# Altium footprint library En.PcbLib: 240 footprints (part 15 of 15)
Each footprint in its own frame and in the unit in brackets; x right, y up, seen from the top. Pads: shape width x height; smd on the part's side, far side on the other; paste and mask are expansions set on the pad; w line width, h text height; cw(c..) or ccw(c..) is an arc to the next point about the centre after c.
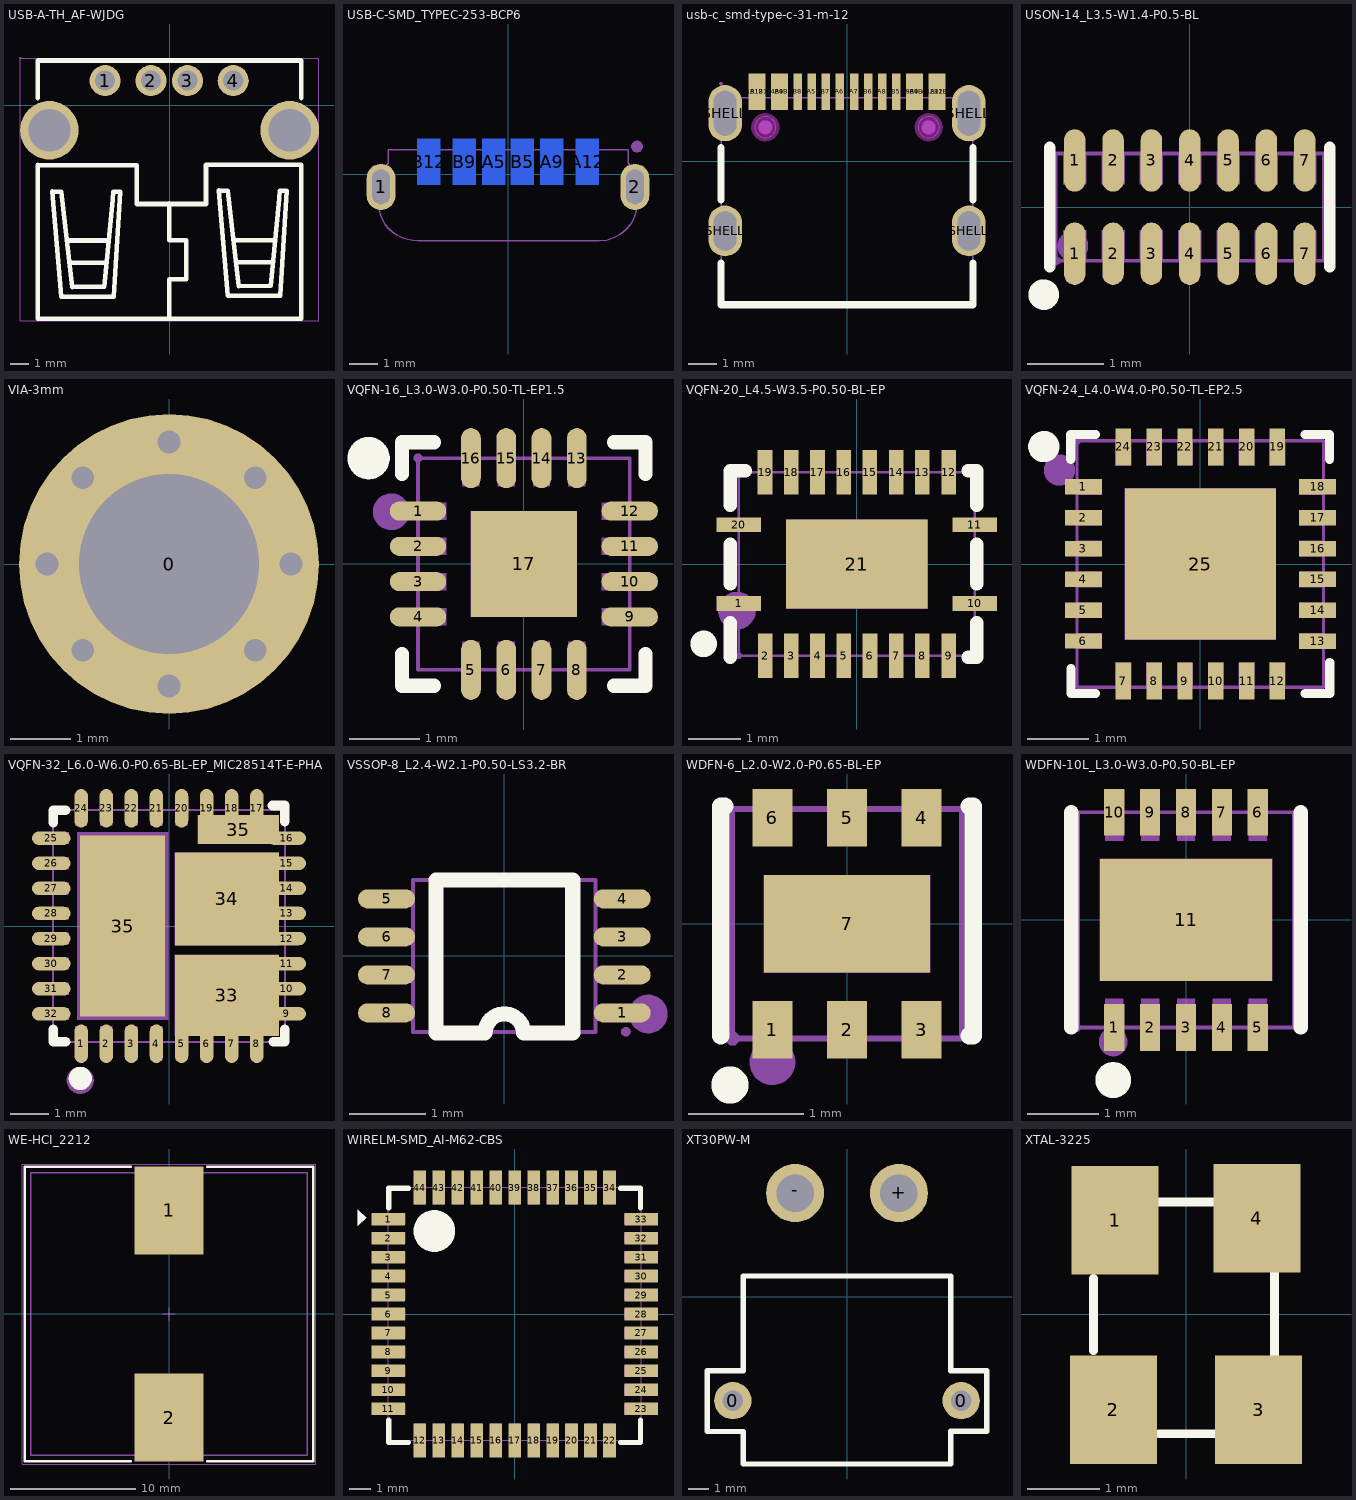
[diagram p14: the footprints below, top view; thin cyan lines are the x and y axes]

## USB-A-TH_AF-WJDG [mm]
pads (6):
  round 1.7 hole 1.1: 1(-3.52,1.355) 2(-1.019,1.355) 3(0.98,1.355) 4(3.48,1.355)
  round 3.2 hole 2.3: ""(-6.57,-1.355) ""(6.57,-1.355)
Top Overlay:
  lines w0.254: -7.199,-3.236 -7.199,-11.655 7.201,-11.655 7.201,-3.236 ; -7.199,0.404 -7.199,2.46 7.201,2.46 7.201,0.404 ; -7.19,-3.266 -1.79,-3.266 -1.79,-5.385 1.99,-5.385 1.99,-3.245 7.19,-3.245 ; -5.609,-7.385 -3.349,-7.385 ; -5.469,-8.595 -3.439,-8.595 ; -0.01,-11.525 -0.01,-9.495 0.91,-9.495 0.91,-7.375 -0.01,-7.375 -0.01,-5.355 ; 3.49,-7.366 5.75,-7.366 ; 3.63,-8.576 5.66,-8.576 ; -6.42,-4.706 -5.911,-4.709 -5.401,-9.25 -5.325,-9.928 -3.576,-9.917 -3.102,-5.139 -3.072,-4.709 -2.691,-4.709 -3.041,-10.452 -5.925,-10.441 -6.42,-4.706 ; 2.682,-4.652 3.19,-4.656 3.701,-9.196 3.776,-9.874 5.526,-9.864 6,-5.085 6.03,-4.655 6.41,-4.655 6.06,-10.398 3.177,-10.387 2.682,-4.652
Mechanical 15:
  region: -8.11,2.587 -8.11,2.612 -8.145,2.647 -8.195,2.648 -8.23,2.612 -8.23,2.588 -8.23,2.563 -8.195,2.528 -8.145,2.527 -8.11,2.563
  region: 7.62,-1.355 7.619,-1.218 7.545,-0.953 7.406,-0.716 7.211,-0.523 6.973,-0.386 6.707,-0.316 6.433,-0.316 6.167,-0.386 5.929,-0.523 5.734,-0.716 5.595,-0.953 5.522,-1.217 5.52,-1.355 5.522,-1.492 5.595,-1.757 5.734,-1.994 5.929,-2.187 6.167,-2.323 6.433,-2.394 6.707,-2.394 6.973,-2.323 7.211,-2.187 7.406,-1.994 7.545,-1.757 7.619,-1.492
  region: -5.52,-1.355 -5.521,-1.218 -5.595,-0.953 -5.734,-0.716 -5.929,-0.523 -6.167,-0.386 -6.433,-0.316 -6.707,-0.316 -6.973,-0.386 -7.211,-0.523 -7.406,-0.716 -7.545,-0.953 -7.618,-1.217 -7.62,-1.355 -7.618,-1.492 -7.545,-1.757 -7.406,-1.994 -7.211,-2.187 -6.973,-2.323 -6.707,-2.394 -6.433,-2.394 -6.167,-2.323 -5.929,-2.187 -5.734,-1.994 -5.595,-1.757 -5.521,-1.492
  region: -3.07,1.355 -3.071,1.444 -3.141,1.607 -3.267,1.732 -3.432,1.8 -3.609,1.8 -3.773,1.732 -3.9,1.607 -3.969,1.444 -3.97,1.355 -3.969,1.266 -3.9,1.103 -3.774,0.978 -3.609,0.91 -3.432,0.91 -3.267,0.978 -3.141,1.103 -3.072,1.266
  region: -0.569,1.355 -0.57,1.444 -0.639,1.607 -0.765,1.732 -0.93,1.8 -1.107,1.8 -1.272,1.732 -1.398,1.607 -1.467,1.444 -1.468,1.355 -1.467,1.266 -1.398,1.103 -1.272,0.978 -1.107,0.91 -0.93,0.91 -0.765,0.978 -0.639,1.103 -0.57,1.266
  region: 1.43,1.355 1.429,1.444 1.36,1.607 1.234,1.732 1.069,1.8 0.892,1.8 0.727,1.732 0.601,1.607 0.532,1.444 0.531,1.355 0.532,1.266 0.601,1.103 0.727,0.978 0.892,0.91 1.069,0.91 1.234,0.978 1.36,1.103 1.429,1.266
  region: 3.93,1.355 3.929,1.444 3.859,1.607 3.733,1.732 3.569,1.8 3.391,1.8 3.227,1.732 3.1,1.607 3.031,1.444 3.03,1.355 3.031,1.266 3.1,1.103 3.227,0.978 3.391,0.91 3.569,0.91 3.733,0.978 3.859,1.103 3.929,1.266
  lines w0.051: -8.17,-11.782 -8.17,2.587 8.17,2.587 8.17,-11.782 -8.17,-11.782
3D body "User Library-USB-A-01.SLDPRT": height 6.95, standoff -4.2, extent -7.9,-11.16 7.9,2.54

## USB-C-SMD_TYPEC-253-BCP6 [mm]
pads (8):
  oval 1x1.6 hole 0.61 slot 1.2 at 90 deg: 1(-4.4,-0.435) 2(4.4,-0.435)
  rect 0.8x1.6 smd far side: A5(-0.5,0.435) A9(1.52,0.435) A12(2.75,0.435) B5(0.5,0.435) B9(-1.52,0.435) B12(-2.75,0.435)
Bottom Overlay:
  lines w0.254: -4.445,-2.27 4.445,-2.27 4.445,-1.395 ; -4.445,-2.143 -4.445,-1.395 ; -4.445,0.665 -4.445,1.286 -3.254,1.286 ; 3.508,1.286 4.445,1.286 4.445,0.665
Mechanical 15:
  region: 4.25,-0.935 4.55,-0.935 4.55,0.065 4.25,0.065
  region: -4.55,-0.935 -4.25,-0.935 -4.25,0.065 -4.55,0.065
  region: 0.24,-0.343 0.76,-0.343 0.76,0.957 0.24,0.957
  region: -0.76,-0.343 -0.24,-0.343 -0.24,0.957 -0.76,0.957
  region: 1.24,-0.343 1.8,-0.343 1.8,0.957 1.24,0.957
  region: -1.8,-0.343 -1.24,-0.343 -1.24,0.957 -1.8,0.957
  region: 2.45,-0.343 3.05,-0.343 3.05,0.957 2.45,0.957
  region: -3.05,-0.343 -2.45,-0.343 -2.45,0.957 -3.05,0.957
  region: 4.672,0.957 4.672,0.917 4.642,0.844 4.585,0.787 4.512,0.757 4.432,0.757 4.359,0.787 4.302,0.844 4.272,0.917 4.272,0.957 4.272,0.997 4.302,1.07 4.359,1.127 4.432,1.157 4.512,1.157 4.585,1.127 4.642,1.07 4.672,0.997
  lines w0.051: -4.47,-1.067 ccw(c-3.314,-1.067) -4.131,-1.885 ccw(c-3.117,-0.871) -3.117,-2.304 -3.105,-2.304 -3.057,-2.305 3.172,-2.305 3.426,-2.282 3.672,-2.205 3.892,-2.084 4.085,-1.929 4.249,-1.727 4.369,-1.508 4.448,-1.259 4.472,-1.006 4.471,0.073 4.36,0.073 4.25,0.273 4.161,0.385 4.16,0.857 -4.16,0.857 -4.16,0.385 -4.252,0.275 -4.356,0.076 -4.469,0.076 -4.47,-0.869 -4.47,-1.067
3D body "typec-253-bcp6.step": height 6.49, standoff -1.01, extent -4.495,-1.971 4.445,1.21

## usb-c_smd-type-c-31-m-12 [mm]
pads (20):
  rect 0.3x1.3 smd paste-100 mask+0.051: A1B12(-3.35,2.474) A1B12(-3.05,2.474) A4B9(-2.55,2.474) A4B9(-2.25,2.474) A5(-1.25,2.474) A6(-0.25,2.474) A7(0.25,2.474) A8(1.25,2.474) A9B4(2.25,2.474) A9B4(2.55,2.474) A12B1(3.05,2.474) A12B1(3.35,2.474) B5(1.75,2.474) B6(0.75,2.474) B7(-0.75,2.474) B8(-1.75,2.474)
  oval 1.2x1.8 hole 0.8 slot 1.4 at 90 deg: SHELL(-4.325,-2.474) SHELL(4.325,-2.474)
  oval 1.2x2 hole 0.8 slot 1.6 at 90 deg: SHELL(-4.325,1.706) SHELL(4.325,1.706)
Top Overlay:
  lines w0.254: -4.469,-3.613 -4.469,-5.094 4.471,-5.094 4.471,-3.612 ; -4.469,-1.376 -4.469,0.487 ; 4.471,-1.376 4.471,0.488
Top Paste:
  drawing of 16 lines, arcs and shapes, not listed
Keep-Out Layer:
  board cut-out: -2.525,1.206 -2.525,1.28 -2.582,1.418 -2.688,1.524 -2.825,1.581 -2.975,1.581 -3.112,1.524 -3.218,1.418 -3.275,1.28 -3.275,1.206 -3.275,1.131 -3.218,0.993 -3.112,0.888 -2.975,0.831 -2.825,0.831 -2.688,0.888 -2.582,0.993 -2.525,1.131
  board cut-out: 3.275,1.206 3.275,1.28 3.218,1.418 3.112,1.524 2.974,1.581 2.825,1.581 2.687,1.524 2.582,1.418 2.525,1.28 2.525,1.206 2.525,1.131 2.582,0.993 2.687,0.888 2.825,0.831 2.974,0.831 3.112,0.888 3.218,0.993 3.275,1.131
Mechanical 1:
  circle w0.025: c-2.9,1.206 r0.375
  circle w0.025: c2.9,1.206 r0.375
Mechanical 6:
  circle w0.25: c2.9,1.206 r0.125
  circle w0.25: c-2.9,1.206 r0.125
Mechanical 15:
  region: -4.415,2.756 -4.416,2.78 -4.451,2.813 -4.499,2.813 -4.534,2.78 -4.535,2.756 -4.534,2.732 -4.499,2.699 -4.451,2.699 -4.416,2.732
  region: -4.475,-2.074 -4.175,-2.074 -4.175,-2.874 -4.475,-2.874
  region: 4.175,-2.074 4.475,-2.074 4.475,-2.874 4.175,-2.874
  region: 4.175,2.256 4.475,2.256 4.475,1.156 4.175,1.156
  region: -4.475,2.256 -4.175,2.256 -4.175,1.156 -4.475,1.156
  region: 3.21,2.756 3.41,2.756 3.41,2.056 3.21,2.056
  region: 3.01,2.756 3.21,2.756 3.21,2.056 3.01,2.056
  region: 1.65,2.756 1.85,2.756 1.85,2.056 1.65,2.056
  region: 1.15,2.756 1.35,2.756 1.35,2.056 1.15,2.056
  region: 0.65,2.756 0.85,2.756 0.85,2.056 0.65,2.056
  region: 0.15,2.756 0.35,2.756 0.35,2.056 0.15,2.056
  region: -0.35,2.756 -0.15,2.756 -0.15,2.056 -0.35,2.056
  region: -0.85,2.756 -0.65,2.756 -0.65,2.056 -0.85,2.056
  region: -1.35,2.756 -1.15,2.756 -1.15,2.056 -1.35,2.056
  region: -1.85,2.756 -1.65,2.756 -1.65,2.056 -1.85,2.056
  region: 2.41,2.756 2.61,2.756 2.61,2.056 2.41,2.056
  region: 2.21,2.756 2.41,2.756 2.41,2.056 2.21,2.056
  region: -2.41,2.756 -2.21,2.756 -2.21,2.056 -2.41,2.056
  region: -2.61,2.756 -2.41,2.756 -2.41,2.056 -2.61,2.056
  region: -3.21,2.756 -3.01,2.756 -3.01,2.056 -3.21,2.056
  region: -3.41,2.756 -3.21,2.756 -3.21,2.056 -3.41,2.056
  lines w0.051: -4.47,-5.094 -4.47,2.256 4.47,2.256 4.47,-5.094 -4.47,-5.094
Multi-Layer keep-out:
  circle w0.254: c-2.9,1.206 r0.375
  circle w0.254: c2.9,1.206 r0.375
3D body "type-c 16pin 2md(073).step": height 3.26, standoff -0.9, extent -4.445,-4.971 4.495,2.609

## USON-14_L3.5-W1.4-P0.5-BL [mm]
pads (14):
  oval 0.28x0.815 smd: 1(-1.5,-0.607) 1(-1.5,0.608) 2(-1,-0.607) 2(-1,0.608) 3(-0.5,-0.607) 3(-0.5,0.608) 4(0,-0.607) 4(0,0.608) 5(0.5,-0.607) 5(0.5,0.608) 6(1,-0.607) 6(1,0.608) 7(1.5,-0.607) 7(1.5,0.608)
Top Overlay:
  circle w0.2: c-1.905,-1.143 r0.1
  lines w0.152: -1.826,-0.776 -1.826,0.776 ; 1.826,-0.776 1.826,0.776
Mechanical 6:
  circle w0.2: c-1.524,-0.508 r0.1
Mechanical 15:
  region: -1.35,0.7 -1.35,0.3 -1.65,0.3 -1.65,0.7
  region: -0.85,0.7 -0.85,0.3 -1.15,0.3 -1.15,0.7
  region: -0.35,0.7 -0.35,0.3 -0.65,0.3 -0.65,0.7
  region: 0.15,0.7 0.15,0.3 -0.15,0.3 -0.15,0.7
  region: 0.65,0.7 0.65,0.3 0.35,0.3 0.35,0.7
  region: 1.15,0.7 1.15,0.3 0.85,0.3 0.85,0.7
  region: 1.65,0.7 1.65,0.3 1.35,0.3 1.35,0.7
  region: 1.65,-0.7 1.65,-0.3 1.35,-0.3 1.35,-0.7
  region: 1.15,-0.7 1.15,-0.3 0.85,-0.3 0.85,-0.7
  region: 0.65,-0.7 0.65,-0.3 0.35,-0.3 0.35,-0.7
  region: 0.15,-0.7 0.15,-0.3 -0.15,-0.3 -0.15,-0.7
  region: -0.35,-0.7 -0.35,-0.3 -0.65,-0.3 -0.65,-0.7
  region: -0.85,-0.7 -0.85,-0.3 -1.15,-0.3 -1.15,-0.7
  region: -1.35,-0.7 -1.35,-0.3 -1.65,-0.3 -1.65,-0.7
  region: -1.69,-0.7 -1.691,-0.675 -1.726,-0.641 -1.775,-0.641 -1.81,-0.675 -1.81,-0.7 -1.81,-0.724 -1.775,-0.759 -1.726,-0.759 -1.691,-0.724
  lines w0.051: -1.75,-0.7 1.75,-0.7 1.75,0.7 -1.75,0.7 -1.75,-0.7
3D body "tpd6e05u06rvzr.step": height 0.48, standoff -0.02, extent -1.75,-0.687 1.75,0.686

## VIA-3mm [mm]
height 1.75
pads (1):
  round 5 hole 3: 0(0,0)
via 2.032,0 diameter 0.508 hole 0.381
via 1.437,1.437 diameter 0.508 hole 0.381
via 0,2.032 diameter 0.508 hole 0.381
via -1.437,1.437 diameter 0.508 hole 0.381
via -2.032,0 diameter 0.508 hole 0.381
via -1.437,-1.437 diameter 0.508 hole 0.381
via 0,-2.032 diameter 0.508 hole 0.381
via 1.437,-1.437 diameter 0.508 hole 0.381
3D body "User Library-Spacer-M3-10mm.STEP": height 10, standoff -8.18, extent -2.912,-2.498 2.861,2.549

## VQFN-16_L3.0-W3.0-P0.50-TL-EP1.5 [mm]
pads (17):
  oval 0.8x0.27 smd paste-100 mask+0.051: 1(-1.5,0.75) 2(-1.5,0.25) 3(-1.5,-0.25) 4(-1.5,-0.75) 9(1.5,-0.75) 10(1.5,-0.25) 11(1.5,0.25) 12(1.5,0.75)
  oval 0.28x0.85 smd paste-100 mask+0.051: 5(-0.75,-1.5) 6(-0.25,-1.5) 7(0.25,-1.5) 8(0.75,-1.5) 13(0.75,1.5) 14(0.25,1.5) 15(-0.25,1.5) 16(-0.75,1.5)
  rect 1.5x1.5 smd paste-100 mask+0.051: 17(0,0)
Top Overlay:
  lines w0.2: -1.725,-1.275 -1.725,-1.725 -1.275,-1.725 ; -1.725,1.275 -1.725,1.725 -1.275,1.725 ; 1.275,-1.725 1.725,-1.725 1.725,-1.275 ; 1.275,1.725 1.725,1.725 1.725,1.275
  lines w0.3: -2.05,1.498 cw(c-2.2,1.499) -2.35,1.499 cw(c-2.2,1.499) -2.05,1.5
Top Paste:
  drawing of 17 lines, arcs and shapes, not listed
Mechanical 6:
  circle w0.26: c-1.88,0.74 r0.13
Mechanical 15:
  region: -0.75,0.75 0.75,0.75 0.75,-0.75 -0.75,-0.75
  region: 1.5,0.87 1.5,0.63 1.1,0.63 1.1,0.87
  region: 1.5,0.37 1.5,0.13 1.1,0.13 1.1,0.37
  region: 1.5,-0.13 1.5,-0.37 1.1,-0.37 1.1,-0.13
  region: 1.5,-0.63 1.5,-0.87 1.1,-0.87 1.1,-0.63
  region: -0.87,1.5 -0.63,1.5 -0.63,1.1 -0.87,1.1
  region: -0.37,1.5 -0.13,1.5 -0.13,1.1 -0.37,1.1
  region: 0.13,1.5 0.37,1.5 0.37,1.1 0.13,1.1
  region: 0.63,1.5 0.87,1.5 0.87,1.1 0.63,1.1
  region: -1.1,-0.63 -1.1,-0.87 -1.5,-0.87 -1.5,-0.63
  region: -1.1,-0.13 -1.1,-0.37 -1.5,-0.37 -1.5,-0.13
  region: -1.1,0.37 -1.1,0.13 -1.5,0.13 -1.5,0.37
  region: -1.1,0.87 -1.1,0.63 -1.5,0.63 -1.5,0.87
  region: 0.63,-1.1 0.87,-1.1 0.87,-1.5 0.63,-1.5
  region: 0.13,-1.1 0.37,-1.1 0.37,-1.5 0.13,-1.5
  region: -0.37,-1.1 -0.13,-1.1 -0.13,-1.5 -0.37,-1.5
  region: -0.87,-1.1 -0.63,-1.1 -0.63,-1.5 -0.87,-1.5
  region: -1.44,1.5 -1.441,1.524 -1.475,1.559 -1.524,1.559 -1.559,1.525 -1.56,1.5 -1.559,1.476 -1.524,1.441 -1.476,1.441 -1.441,1.476
  lines w0.051: -1.5,-1.5 -1.5,1.5 1.5,1.5 1.5,-1.5 -1.5,-1.5
3D body "ma730gq-p.step": height 0.81, standoff -0.02, extent -1.51,-1.51 1.51,1.51

## VQFN-20_L4.5-W3.5-P0.50-BL-EP [mm]
pads (21):
  rect 0.85x0.28 smd: 1(-2.25,-0.752) 10(2.25,-0.752) 11(2.25,0.748) 20(-2.25,0.75)
  rect 0.28x0.85 smd: 2(-1.749,-1.75) 3(-1.248,-1.75) 4(-0.749,-1.75) 5(-0.248,-1.75) 6(0.251,-1.75) 7(0.752,-1.75) 8(1.251,-1.75) 9(1.752,-1.75) 12(1.752,1.75) 13(1.251,1.75) 14(0.75,1.748) 15(0.25,1.748) 16(-0.25,1.748) 17(-0.75,1.748) 18(-1.25,1.748) 19(-1.75,1.748)
  rect 2.7x1.7 smd: 21(0,-0.002)
Top Overlay:
  circle w0.254: c-2.921,-1.524 r0.127
  lines w0.254: -2.413,-1.778 -2.413,-1.123 ; -2.413,-0.381 -2.413,0.379 ; -2.413,1.121 -2.413,1.778 -2.121,1.778 ; 2.123,-1.778 2.286,-1.778 2.286,-1.123 ; 2.123,1.778 2.286,1.778 2.286,1.119 ; 2.286,-0.381 2.286,0.377
Mechanical 6:
  circle w0.36: c-2.286,-0.889 r0.18
Mechanical 15:
  region: -2.19,-1.75 -2.191,-1.726 -2.226,-1.693 -2.274,-1.693 -2.309,-1.726 -2.31,-1.75 -2.309,-1.774 -2.274,-1.807 -2.226,-1.807 -2.191,-1.774
  region: -1.35,-0.852 -1.35,0.848 1.35,0.848 1.35,-0.852
  region: -1.629,-1.75 -1.869,-1.75 -1.869,-1.35 -1.629,-1.35
  region: -1.128,-1.75 -1.368,-1.75 -1.368,-1.35 -1.128,-1.35
  region: -0.629,-1.75 -0.869,-1.75 -0.869,-1.35 -0.629,-1.35
  region: -0.128,-1.75 -0.368,-1.75 -0.368,-1.35 -0.128,-1.35
  region: 0.371,-1.75 0.131,-1.75 0.131,-1.35 0.371,-1.35
  region: 0.872,-1.75 0.632,-1.75 0.632,-1.35 0.872,-1.35
  region: 1.371,-1.75 1.131,-1.75 1.131,-1.35 1.371,-1.35
  region: 1.872,-1.75 1.632,-1.75 1.632,-1.35 1.872,-1.35
  region: -1.872,1.746 -1.632,1.746 -1.632,1.346 -1.872,1.346
  region: -1.371,1.746 -1.131,1.746 -1.131,1.346 -1.371,1.346
  region: -0.872,1.746 -0.632,1.746 -0.632,1.346 -0.872,1.346
  region: -0.371,1.746 -0.131,1.746 -0.131,1.346 -0.371,1.346
  region: 0.128,1.746 0.368,1.746 0.368,1.346 0.128,1.346
  region: 0.629,1.746 0.869,1.746 0.869,1.346 0.629,1.346
  region: 1.128,1.746 1.368,1.746 1.368,1.346 1.128,1.346
  region: 1.629,1.746 1.869,1.746 1.869,1.346 1.629,1.346
  region: -2.248,0.629 -2.248,0.869 -1.848,0.869 -1.848,0.629
  region: -2.248,-0.874 -2.248,-0.634 -1.848,-0.634 -1.848,-0.874
  region: 2.248,0.87 2.248,0.63 1.848,0.63 1.848,0.87
  region: 2.248,-0.631 2.248,-0.871 1.848,-0.871 1.848,-0.631
  lines w0.051: -2.25,-1.75 2.25,-1.75 2.25,1.75 -2.25,1.75 -2.25,-1.75
3D body "lm5146rgyr.step": height 1, standoff -0.02, extent -2.26,-1.76 2.26,1.76

## VQFN-24_L4.0-W4.0-P0.50-TL-EP2.5 [mm]
pads (25):
  rect 0.6x0.25 smd paste-100 mask+0.05: 1(-1.9,1.25) 2(-1.9,0.75) 3(-1.9,0.25) 4(-1.9,-0.25) 5(-1.9,-0.75) 6(-1.9,-1.25) 13(1.9,-1.25) 14(1.9,-0.75) 15(1.9,-0.25) 16(1.9,0.25) 17(1.9,0.75) 18(1.9,1.25)
  rect 0.25x0.6 smd paste-100 mask+0.05: 7(-1.25,-1.9) 8(-0.75,-1.9) 9(-0.25,-1.9) 10(0.25,-1.9) 11(0.75,-1.9) 12(1.25,-1.9) 19(1.25,1.9) 20(0.75,1.9) 21(0.25,1.9) 22(-0.25,1.9) 23(-0.75,1.9) 24(-1.25,1.9)
  rect 2.45x2.45 smd paste-100 mask+0.05: 25(0,0)
Top Overlay:
  circle w0.254: c-2.54,1.905 r0.127
  lines w0.15: -2.104,1.7 -2.104,2.1 -1.7,2.1 ; -2.1,-1.7 -2.1,-2.1 -1.7,-2.1 ; 1.695,2.1 2.095,2.1 2.095,1.7 ; 1.7,-2.1 2.1,-2.1 2.1,-1.6
Top Paste:
  region: -0.98,0.98 0.98,0.98 0.98,-0.98 -0.98,-0.98
  region: -2.2,1.375 -1.6,1.375 -1.6,1.125 -2.2,1.125
  region: -2.2,0.875 -1.6,0.875 -1.6,0.625 -2.2,0.625
  region: -2.2,0.375 -1.6,0.375 -1.6,0.125 -2.2,0.125
  region: -2.2,-0.125 -1.6,-0.125 -1.6,-0.375 -2.2,-0.375
  region: -2.2,-0.625 -1.6,-0.625 -1.6,-0.875 -2.2,-0.875
  region: -2.2,-1.125 -1.6,-1.125 -1.6,-1.375 -2.2,-1.375
  region: -1.375,-1.6 -1.125,-1.6 -1.125,-2.2 -1.375,-2.2
  region: -0.875,-1.6 -0.625,-1.6 -0.625,-2.2 -0.875,-2.2
  region: -0.375,-1.6 -0.125,-1.6 -0.125,-2.2 -0.375,-2.2
  region: 0.125,-1.6 0.375,-1.6 0.375,-2.2 0.125,-2.2
  region: 0.625,-1.6 0.875,-1.6 0.875,-2.2 0.625,-2.2
  region: 1.125,-1.6 1.375,-1.6 1.375,-2.2 1.125,-2.2
  region: 1.6,-1.125 2.2,-1.125 2.2,-1.375 1.6,-1.375
  region: 1.6,-0.625 2.2,-0.625 2.2,-0.875 1.6,-0.875
  region: 1.6,-0.125 2.2,-0.125 2.2,-0.375 1.6,-0.375
  region: 1.6,0.375 2.2,0.375 2.2,0.125 1.6,0.125
  region: 1.6,0.875 2.2,0.875 2.2,0.625 1.6,0.625
  region: 1.6,1.375 2.2,1.375 2.2,1.125 1.6,1.125
  region: 1.125,2.2 1.375,2.2 1.375,1.6 1.125,1.6
  region: 0.625,2.2 0.875,2.2 0.875,1.6 0.625,1.6
  region: 0.125,2.2 0.375,2.2 0.375,1.6 0.125,1.6
  region: -0.375,2.2 -0.125,2.2 -0.125,1.6 -0.375,1.6
  region: -0.875,2.2 -0.625,2.2 -0.625,1.6 -0.875,1.6
  region: -1.375,2.2 -1.125,2.2 -1.125,1.6 -1.375,1.6
Mechanical 6:
  circle w0.254: c-2.286,1.524 r0.127
Mechanical 15:
  region: -1.94,2 -1.941,2.024 -1.976,2.057 -2.024,2.057 -2.059,2.024 -2.06,2 -2.059,1.976 -2.024,1.943 -1.976,1.943 -1.941,1.976
  region: -1.375,2 -1.125,2 -1.125,1.6 -1.375,1.6
  region: -0.875,2 -0.625,2 -0.625,1.6 -0.875,1.6
  region: -0.375,2 -0.125,2 -0.125,1.6 -0.375,1.6
  region: 0.125,2 0.375,2 0.375,1.6 0.125,1.6
  region: 0.625,2 0.875,2 0.875,1.6 0.625,1.6
  region: 1.125,2 1.375,2 1.375,1.6 1.125,1.6
  region: 1.6,1.375 2,1.375 2,1.125 1.6,1.125
  region: 1.6,0.875 2,0.875 2,0.625 1.6,0.625
  region: 1.6,0.375 2,0.375 2,0.125 1.6,0.125
  region: 1.6,-0.125 2,-0.125 2,-0.375 1.6,-0.375
  region: 1.6,-0.625 2,-0.625 2,-0.875 1.6,-0.875
  region: 1.6,-1.125 2,-1.125 2,-1.375 1.6,-1.375
  region: 1.125,-1.6 1.375,-1.6 1.375,-2 1.125,-2
  region: 0.625,-1.6 0.875,-1.6 0.875,-2 0.625,-2
  region: 0.125,-1.6 0.375,-1.6 0.375,-2 0.125,-2
  region: -0.375,-1.6 -0.125,-1.6 -0.125,-2 -0.375,-2
  region: -0.875,-1.6 -0.625,-1.6 -0.625,-2 -0.875,-2
  region: -1.375,-1.6 -1.125,-1.6 -1.125,-2 -1.375,-2
  region: -2,-1.125 -1.6,-1.125 -1.6,-1.375 -2,-1.375
  region: -2,-0.625 -1.6,-0.625 -1.6,-0.875 -2,-0.875
  region: -2,-0.125 -1.6,-0.125 -1.6,-0.375 -2,-0.375
  region: -2,0.375 -1.6,0.375 -1.6,0.125 -2,0.125
  region: -2,0.875 -1.6,0.875 -1.6,0.625 -2,0.625
  region: -2,1.375 -1.6,1.375 -1.6,1.125 -2,1.125
  region: -1.225,1.225 1.225,1.225 1.225,-1.225 -1.225,-1.225
  lines w0.051: -2,-2 -2,2 2,2 2,-2 -2,-2
3D body "lm5141qrgetq1.step": height 1, standoff -0.02, extent -2.01,-2.01 2.01,2.01

## VQFN-32_L6.0-W6.0-P0.65-BL-EP_MIC28514T-E-PHA [mm]
pads (36):
  oval 0.35x1 smd paste-100 mask+0.05: 1(-2.275,-3.05) 2(-1.625,-3.05) 3(-0.975,-3.05) 4(-0.325,-3.05) 5(0.325,-3.05) 6(0.975,-3.05) 7(1.625,-3.05) 8(2.275,-3.05) 17(2.275,3.05) 18(1.625,3.05) 19(0.975,3.05) 20(0.325,3.05) 21(-0.325,3.05) 22(-0.975,3.05) 23(-1.625,3.05) 24(-2.275,3.05)
  oval 1x0.35 smd paste-100 mask+0.05: 9(3.05,-2.275) 10(3.05,-1.625) 11(3.05,-0.975) 12(3.05,-0.325) 13(3.05,0.325) 14(3.05,0.975) 15(3.05,1.625) 16(3.05,2.275) 25(-3.05,2.275) 26(-3.05,1.625) 27(-3.05,0.975) 28(-3.05,0.325) 29(-3.05,-0.325) 30(-3.05,-0.975) 31(-3.05,-1.625) 32(-3.05,-2.275)
  rect 2.7x2.1 smd paste-100 mask+0.05: 33(1.5,-1.8)
  rect 2.7x2.4 smd paste-100 mask+0.05: 34(1.5,0.7)
  rect 2.2x4.7 smd paste-100 mask+0.05: 35(-1.2,0)
  rect 2.1x0.75 smd paste-100 mask+0.05: 35(1.8,2.5)
Top Overlay:
  lines w0.254: -3,-2.681 -3,-3 -2.681,-3 ; -3,2.681 -3,3 -2.681,3 ; 2.681,3.12 2.893,3.12 3,3.12 3,2.7 ; 2.7,-3 3,-3 3,-2.681
  lines w0.3: -2.3,-3.8 ccw(c-2.299,-3.95) -2.299,-4.1 ccw(c-2.299,-3.95) -2.297,-3.8
Top Paste:
  drawing of 21 lines, arcs and shapes, not listed
Mechanical 6:
  circle w0.254: c-2.3,-4 r0.224
Mechanical 15:
  drawing of 41 lines, arcs and shapes, not listed
3D body "mic28516t-e_pha.step": height 0.78, standoff -0.02, extent -3.001,-3.001 3.001,3.001

## VSSOP-8_L2.4-W2.1-P0.50-LS3.2-BR [mm]
pads (8):
  oval 0.75x0.25 smd: 1(1.55,-0.75) 2(1.55,-0.25) 3(1.55,0.25) 4(1.55,0.75) 5(-1.55,0.75) 6(-1.55,0.25) 7(-1.55,-0.25) 8(-1.55,-0.75)
Top Overlay:
  lines w0.2: -0.9,-1.016 -0.254,-1.016 cw(c0,-1.016) 0.254,-1.016 0.9,-1.016 ; -0.9,-1 -0.9,1 0.9,1 0.9,-1
Mechanical 6:
  circle w0.254: c1.894,-0.764 r0.127
Mechanical 15:
  region: -1.6,-0.855 -1.6,-0.645 -1.375,-0.645 -1.375,-0.855
  region: -1.385,-0.855 -1.385,-0.645 -1.19,-0.645 -1.19,-0.855
  region: -1.6,-0.355 -1.6,-0.145 -1.375,-0.145 -1.375,-0.355
  region: -1.385,-0.355 -1.385,-0.145 -1.19,-0.145 -1.19,-0.355
  region: -1.6,0.145 -1.6,0.355 -1.375,0.355 -1.375,0.145
  region: -1.385,0.145 -1.385,0.355 -1.19,0.355 -1.19,0.145
  region: -1.6,0.645 -1.6,0.855 -1.375,0.855 -1.375,0.645
  region: -1.385,0.645 -1.385,0.855 -1.19,0.855 -1.19,0.645
  region: 1.375,0.645 1.375,0.855 1.6,0.855 1.6,0.645
  region: 1.19,0.645 1.19,0.855 1.385,0.855 1.385,0.645
  region: 1.375,0.145 1.375,0.355 1.6,0.355 1.6,0.145
  region: 1.19,0.145 1.19,0.355 1.385,0.355 1.385,0.145
  region: 1.375,-0.355 1.375,-0.145 1.6,-0.145 1.6,-0.355
  region: 1.19,-0.355 1.19,-0.145 1.385,-0.145 1.385,-0.355
  region: 1.375,-0.855 1.375,-0.645 1.6,-0.645 1.6,-0.855
  region: 1.19,-0.855 1.19,-0.645 1.385,-0.645 1.385,-0.855
  region: 1.659,-0.998 1.659,-0.974 1.624,-0.94 1.575,-0.94 1.54,-0.974 1.54,-0.998 1.54,-1.022 1.575,-1.056 1.624,-1.056 1.659,-1.022
  lines w0.051: -1.2,-1 -1.2,1 1.2,1 1.2,-1 -1.2,-1
3D body "sn74lvc2t45dcur.step": height 0.9, standoff -0.15, extent -1.756,-1 1.756,1

## WDFN-6_L2.0-W2.0-P0.65-BL-EP [mm]
pads (7):
  rect 0.35x0.5 smd: 1(-0.65,-0.925) 2(0,-0.925) 3(0.65,-0.925) 4(0.65,0.925) 5(0,0.925) 6(-0.65,0.925)
  rect 1.45x0.85 smd: 7(0,0)
Top Overlay:
  circle w0.254: c-1.02,-1.405 r0.035
  lines w0.152: -1.1,-0.975 -1.1,1.025 -1.066,1.025 ; 1.066,-0.975 1.1,-0.975 1.1,1.025 1.066,1.025
Mechanical 6:
  circle w0.2: c-0.65,-1.205 r0.1
Mechanical 15:
  region: -0.8,-0.75 -0.5,-0.75 -0.5,-1 -0.8,-1
  region: -0.15,-0.75 0.15,-0.75 0.15,-1 -0.15,-1
  region: 0.5,-0.75 0.8,-0.75 0.8,-1 0.5,-1
  region: 0.5,1 0.8,1 0.8,0.75 0.5,0.75
  region: -0.15,1 0.15,1 0.15,0.75 -0.15,0.75
  region: -0.8,1 -0.5,1 -0.5,0.75 -0.8,0.75
  region: 0.725,-0.425 -0.725,-0.425 -0.725,0.425 0.725,0.425
  region: -0.94,-1 -0.941,-0.976 -0.976,-0.942 -1.024,-0.942 -1.059,-0.976 -1.06,-1 -1.059,-1.024 -1.024,-1.057 -0.976,-1.057 -0.941,-1.024
  lines w0.051: -1,-1 -1,1 1,1 1,-1 -1,-1
3D body "User Library-LT3008 DFN6.SLDPRT": height 0.75, standoff -0.01, extent -1,-1.001 1,1.001

## WDFN-10L_L3.0-W3.0-P0.50-BL-EP [mm]
pads (11):
  rect 0.28x0.65 smd: 1(-1.001,-1.5) 2(-0.5,-1.5) 3(0,-1.5) 4(0.5,-1.5) 5(1.001,-1.5) 6(1.001,1.5) 7(0.5,1.5) 8(0,1.5) 9(-0.5,1.5) 10(-1.001,1.5)
  rect 2.4x1.7 smd: 11(0,0)
Top Overlay:
  lines w0.2: -1.6,-1.5 -1.6,1.5 ; 1.6,-1.5 1.6,1.5
  lines w0.25: -1.016,-2.108 ccw(c-1.015,-2.233) -1.015,-2.358 ccw(c-1.015,-2.233) -1.013,-2.108
Mechanical 6:
  circle w0.2: c-1.016,-1.702 r0.1
Mechanical 15:
  region: -1.464,-1.499 -1.465,-1.474 -1.5,-1.44 -1.548,-1.44 -1.583,-1.474 -1.584,-1.499 -1.583,-1.523 -1.548,-1.557 -1.499,-1.557 -1.465,-1.523
  region: -1.126,1.5 -0.876,1.5 -0.876,1.1 -1.126,1.1
  region: -0.625,1.5 -0.375,1.5 -0.375,1.1 -0.625,1.1
  region: -0.125,1.5 0.125,1.5 0.125,1.1 -0.125,1.1
  region: 0.375,1.5 0.625,1.5 0.625,1.1 0.375,1.1
  region: 0.876,1.5 1.126,1.5 1.126,1.1 0.876,1.1
  region: 0.876,-1.1 1.126,-1.1 1.126,-1.5 0.876,-1.5
  region: 0.375,-1.1 0.625,-1.1 0.625,-1.5 0.375,-1.5
  region: -0.125,-1.1 0.125,-1.1 0.125,-1.5 -0.125,-1.5
  region: -0.625,-1.1 -0.375,-1.1 -0.375,-1.5 -0.625,-1.5
  region: -1.126,-1.1 -0.876,-1.1 -0.876,-1.5 -1.126,-1.5
  region: -1.2,-0.85 -1.2,0.85 1.2,0.85 1.2,-0.85
  lines w0.051: -1.5,-1.5 1.5,-1.5 1.5,1.5 -1.5,1.5 -1.5,-1.5
3D body "mx5069hd.step": height 0.82, standoff 0, extent -1.5,-1.51 1.5,1.51

## WE-HCI_2212 [mm] "SMT Flat Wire High Current Inductor, body 22x22.5mm"
height 12
pads (2):
  rect 5.5x7 smd: 1(0,8.25) 2(0,-8.25)
Top Overlay:
  lines w0.2: -3.05,-11.75 -11.5,-11.75 -11.5,11.75 -3.05,11.75 ; 3.05,-11.75 11.5,-11.75 11.5,11.75 3.05,11.75
Mechanical 13:
  lines w0.1: -11,-11.25 11,-11.25 11,11.25 -11,11.25 -11,-11.25
Mechanical 15:
  lines w0.05: -0.5,0 0.5,0 ; 0,-0.5 0,0.5 ; -11.7,-11.95 -11.7,11.95 11.7,11.95 11.7,-11.95 -11.7,-11.95
3D body "7443558xxxx.stp": height 12, standoff 0, extent -11,-11.25 11,11.25

## WIRELM-SMD_AI-M62-CBS [mm]
pads (44):
  rect 1.6x0.6 smd: 1(-6,4.5) 2(-6,3.6) 3(-6,2.7) 4(-6,1.8) 5(-6,0.9) 6(-6,0) 7(-6,-0.9) 8(-6,-1.8) 9(-6,-2.7) 10(-6,-3.6) 11(-6,-4.5) 23(6,-4.5) 24(6,-3.6) 25(6,-2.7) 26(6,-1.8) 27(6,-0.9) 28(6,0) 29(6,0.9) 30(6,1.8) 31(6,2.7) 32(6,3.6) 33(6,4.5)
  rect 0.6x1.6 smd: 12(-4.5,-6) 13(-3.6,-6) 14(-2.7,-6) 15(-1.8,-6) 16(-0.9,-6) 17(0,-6) 18(0.9,-6) 19(1.8,-6) 20(2.7,-6) 21(3.6,-6) 22(4.5,-6) 34(4.5,6) 35(3.6,6) 36(2.7,6) 37(1.8,6) 38(0.9,6) 39(0,6) 40(-0.9,6) 41(-1.8,6) 42(-2.7,6) 43(-3.6,6) 44(-4.5,6)
Top Overlay:
  region: -7.429,4.191 -7.429,4.953 -7.048,4.572
  region: -4.789,3.937 -4.789,4.066 -4.722,4.315 -4.593,4.538 -4.411,4.72 -4.188,4.849 -3.939,4.916 -3.681,4.916 -3.432,4.849 -3.209,4.72 -3.027,4.538 -2.898,4.315 -2.831,4.066 -2.831,3.937 -2.831,3.808 -2.898,3.559 -3.027,3.336 -3.209,3.154 -3.432,3.025 -3.681,2.958 -3.939,2.958 -4.188,3.025 -4.411,3.154 -4.593,3.336 -4.722,3.559 -4.789,3.808
  lines w0.254: -5.969,-5.031 -5.969,-6.096 -5.031,-6.096 ; -5.969,5.031 -5.969,5.969 -5.031,5.969 -5.08,5.969 ; 5.031,-6.096 5.969,-6.096 5.969,-5.031 ; 5.031,5.969 5.969,5.969 5.969,5.031
Mechanical 6:
  region: -7.429,4.191 -7.429,4.953 -7.048,4.572
Mechanical 15:
  drawing of 49 lines, arcs and shapes, not listed
3D body "ai-m62-cbs(blifn4).step": height 2.01, standoff -0.01, extent -6,-6 6,6

## XT30PW-M [mm]
pads (4):
  round 1.8 hole 1: 0(-5.5,-5) 0(5.5,-5)
  round 2.8 hole 1.8: +(2.5,5) -(-2.5,5)
Top Overlay:
  lines w0.254: -6.731,-6.48 -5,-6.48 -5,-8.05 5,-8.05 5,-6.477 6.731,-6.477 6.731,-3.559 5,-3.559 5,1 -5,1 -5,-3.559 -6.731,-3.559 -6.731,-6.48
3D body "XT30PW-M.stp": height 5.29, standoff -2.21, extent -6.65,-8 6.65,5.95

## XTAL-3225 [mm]
pads (4):
  rect 1.2x1.5 smd: 1(-0.978,1.295) 2(-1.003,-1.321) 3(1.003,-1.321) 4(0.978,1.321)
Top Overlay:
  lines w0.12: -1.278,-0.505 -1.278,0.495 ; -0.378,-1.655 0.422,-1.655 ; -0.378,1.545 0.422,1.545 ; 1.222,-0.605 1.222,0.595
3D body "XTAL-3225.STEP": height 0.8, standoff 0, extent -1.268,-1.651 1.232,1.549